# Altium footprint library 模块.PcbLib: 18 footprints (part 2 of 2)
Each footprint in its own frame and in the unit in brackets; x right, y up, seen from the top. Pads: shape width x height; smd on the part's side, far side on the other; paste and mask are expansions set on the pad; w line width, h text height; cw(c..) or ccw(c..) is an arc to the next point about the centre after c.
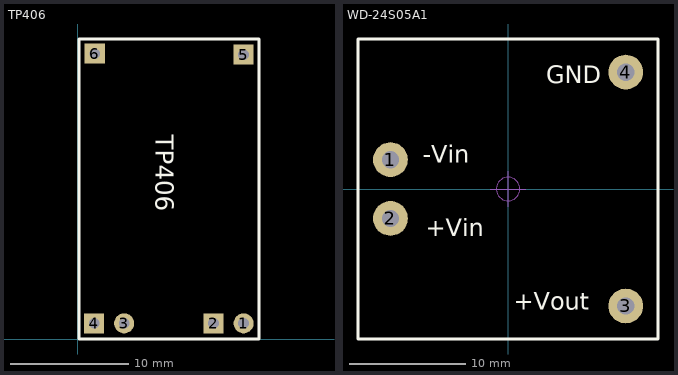
[diagram p1: the footprints below, top view; thin cyan lines are the x and y axes]

## TP406 [mm]
pads (6):
  round 1.7 hole 0.9: 1(14.021,1.321) 3(3.912,1.321)
  rect 1.7x1.7 hole 0.9: 2(11.481,1.321) 4(1.372,1.321) 5(14.021,24.079) 6(1.422,24.155)
Top Overlay:
  lines w0.254: 0.102,0 0.102,25.4 15.316,25.4 15.316,0 0.102,0
  text "TP406" at 6.604,17.297 h1.52

## WD-24S05A1 [mm] "3W-24V转5V模块"
pads (4):
  round 3 hole 1.5: 1(-10.15,2.538) 2(-10.15,-2.542) 3(10.17,-10.102) 4(10.17,10.098)
Top Overlay:
  lines w0.254: -12.954,-12.954 12.954,-12.954 12.954,12.954 -12.954,12.954 -12.954,-12.954
  text "+Vout" at 0.508,-10.414 h1.52
  text "GND" at 3.302,9.144 h1.52
  text "-Vin" at -7.366,2.286 h1.52
  text "+Vin" at -7.112,-4.064 h1.52
Mechanical 15:
  circle w0.1: c0,0 r1.016
  lines w0.1: -1.524,0 1.524,0 ; 0,-1.524 0,1.524
3D body "WD3-24S05A1.STEP": height 8.6, standoff -3.1, extent -12.75,-12.75 12.75,12.75